# Altium footprint library ref-packages-longpad.PCBLIB: 1527 footprints (part 39 of 103)
Each footprint in its own frame and in the unit in brackets; x right, y up, seen from the top. Pads: shape width x height; smd on the part's side, far side on the other; paste and mask are expansions set on the pad; w line width, h text height; cw(c..) or ccw(c..) is an arc to the next point about the centre after c.
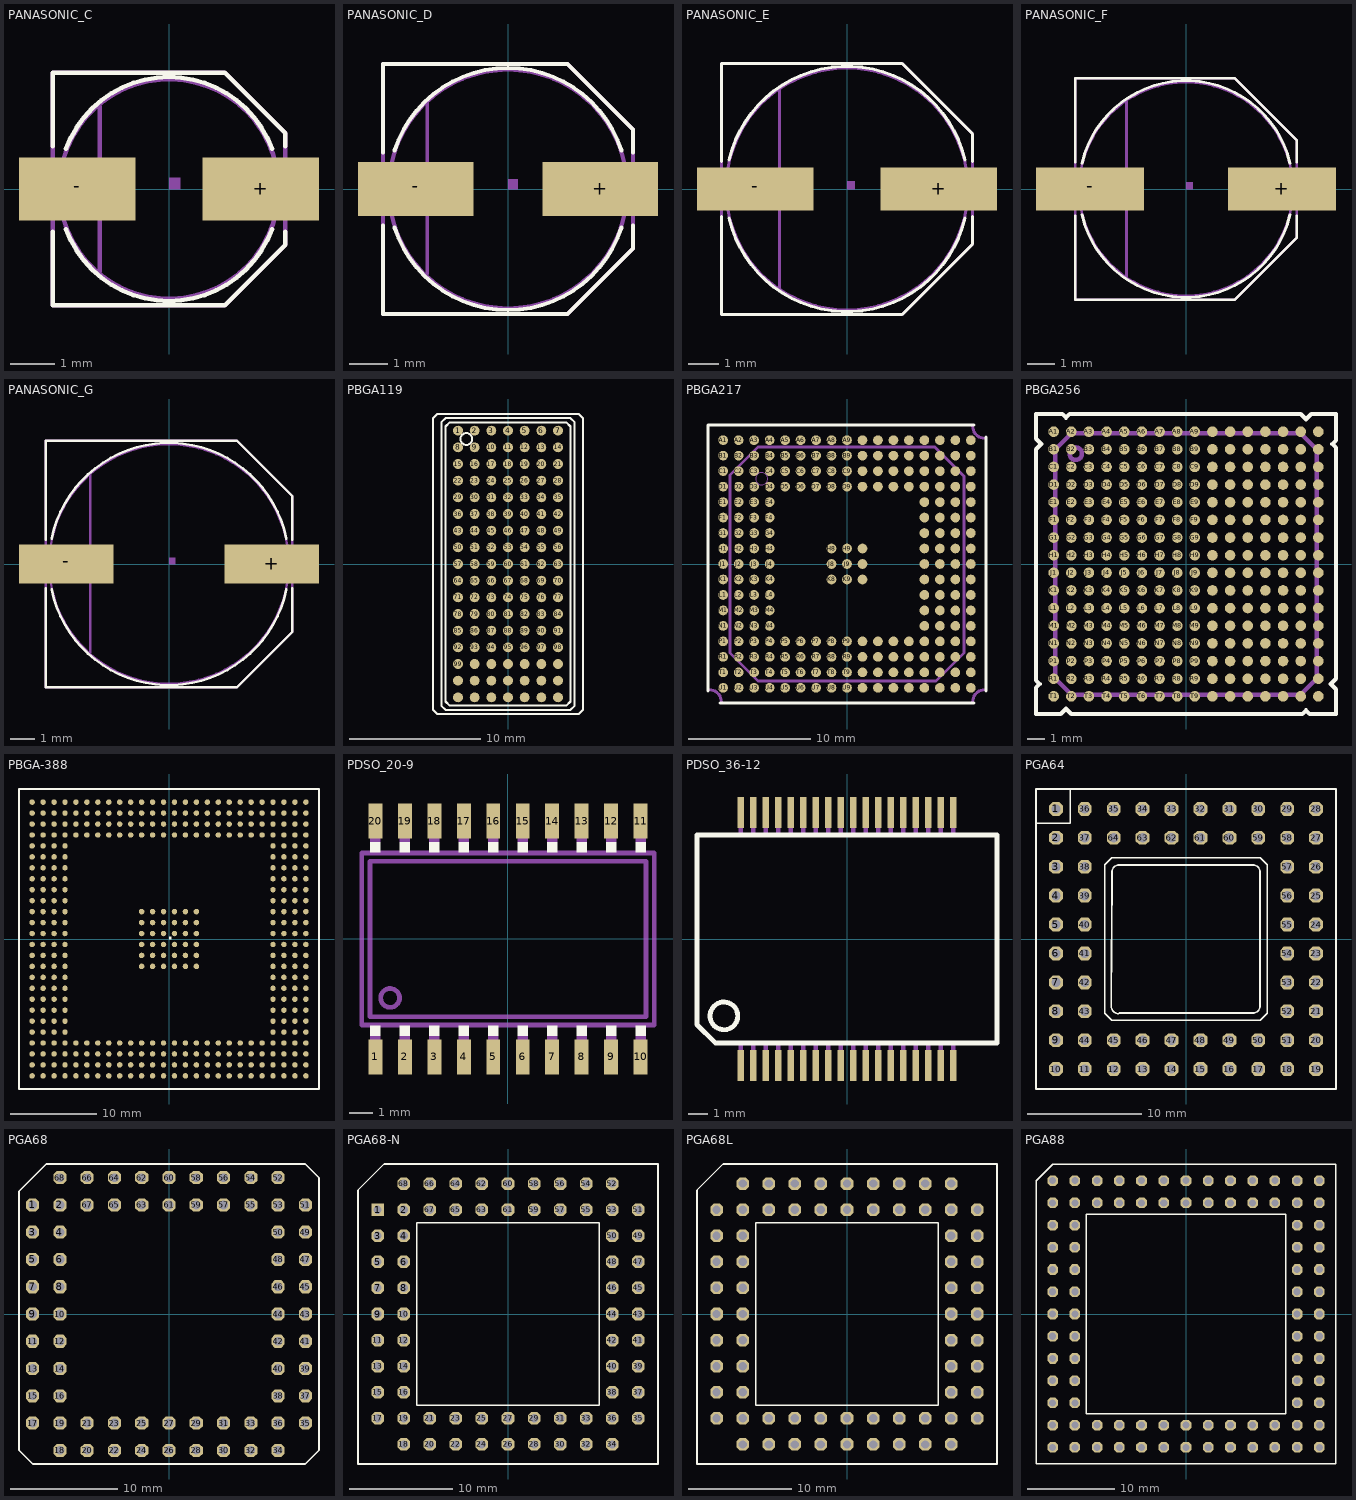
[diagram p38: the footprints below, top view; thin cyan lines are the x and y axes]

## PANASONIC_C [mil]
pads (2):
  rect 102.36x55.12 smd: +(80.71,0) -(-80.71,0)
Top Overlay:
  lines w4: -102.36,-37.4 -102.36,-102.36 49.21,-102.36 102.36,-49.21 102.36,-37.4 ; -102.36,37.4 -102.36,102.36 49.21,102.36 102.36,49.21 102.36,37.4 ; -90.55,-35.46 ccw(c0,-1.95) 90.55,-35.46 ; -90.55,35.46 cw(c0,1.95) 90.55,35.46
Mechanical 16:
  circle w4: c0,0 r96.46
  rectangle: -116.14,-13.78 -94.49,13.78
  rectangle: 94.49,-13.78 116.14,13.78
  region: 0,0 10,0 10,10 0,10
  lines w4: -61.02,-72.83 -61.02,72.83 ; -102.36,-102.36 49.21,-102.36 102.36,-49.21 102.36,49.21 49.21,102.36 -102.36,102.36 -102.36,-102.36

## PANASONIC_D [mm]
pads (2):
  rect 3x1.4 smd: +(2.4,0) -(-2.4,0)
Top Overlay:
  lines w0.102: -3.25,-0.95 -3.25,-3.25 1.55,-3.25 3.25,-1.55 3.25,-0.95 ; -3.25,0.95 -3.25,3.25 1.55,3.25 3.25,1.55 3.25,0.95 ; -2.95,-1.001 ccw(c0,-0.048) 2.95,-1.001 ; -2.95,1.001 cw(c0,0.048) 2.95,1.001
Mechanical 16:
  circle w0.102: c0,0 r3.1
  rectangle: -3.65,-0.35 -3.05,0.35
  rectangle: 3.05,-0.35 3.65,0.35
  region: 0,0 0.254,0 0.254,0.254 0,0.254
  lines w0.102: -2.1,-2.2 -2.1,2.25 ; -3.25,-3.25 1.55,-3.25 3.25,-1.55 3.25,1.55 1.55,3.25 -3.25,3.25 -3.25,-3.25

## PANASONIC_E [mm]
pads (2):
  rect 3.8x1.4 smd: +(3,0) -(-3,0)
Top Overlay:
  lines w0.102: -4.1,-0.9 -4.1,-4.1 1.8,-4.1 4.1,-1.8 4.1,-0.9 ; -4.1,0.9 -4.1,4.1 1.8,4.1 4.1,1.8 4.1,0.9 ; -3.85,-0.951 ccw(c0,-0.057) 3.85,-0.951 ; -3.85,0.951 cw(c0,0.057) 3.85,0.951
Mechanical 16:
  circle w0.102: c0,0 r3.95
  rectangle: -4.5,-0.35 -3.8,0.35
  rectangle: 3.8,-0.35 4.5,0.35
  region: 0,0 0.254,0 0.254,0.254 0,0.254
  lines w0.102: -2.2,-3.25 -2.2,3.25 ; -4.1,-4.1 1.8,-4.1 4.1,-1.8 4.1,1.8 1.8,4.1 -4.1,4.1 -4.1,-4.1

## PANASONIC_F [mm]
pads (2):
  rect 4x1.6 smd: +(3.55,0) -(-3.55,0)
Top Overlay:
  lines w0.102: -4.1,-1 -4.1,-4.1 1.8,-4.1 4.1,-1.8 4.1,-1 ; -4.1,1 -4.1,4.1 1.8,4.1 4.1,1.8 4.1,1 ; -3.85,-0.951 ccw(c0,-0.057) 3.85,-0.951 ; -3.85,0.951 cw(c0,0.057) 3.85,0.951
Mechanical 16:
  circle w0.001: c0,0 r4
  circle w0.102: c0,0 r3.95
  rectangle: -4.85,-0.45 -3.9,0.45
  rectangle: 3.9,-0.45 4.85,0.45
  region: 0,0 0.254,0 0.254,0.254 0,0.254
  lines w0.102: -2.2,-3.25 -2.2,3.25 ; -4.1,-4.1 1.8,-4.1 4.1,-1.8 4.1,1.8 1.8,4.1 -4.1,4.1 -4.1,-4.1

## PANASONIC_G [mil]
pads (2):
  rect 153.54x62.99 smd: +(167.32,0) -(-167.32,0)
Top Overlay:
  lines w4: -200.79,-39.37 -200.79,-200.79 110.24,-200.79 200.79,-110.24 200.79,-39.37 ; -200.79,39.37 -200.79,200.79 110.24,200.79 200.79,110.24 200.79,39.37 ; -190.94,-41.37 ccw(c0,-2.28) 190.94,-41.37 ; -190.94,41.37 cw(c0,2.28) 190.94,41.37
Mechanical 16:
  circle w4: c0,0 r194.88
  rectangle: -230.32,-17.72 -192.91,17.72
  rectangle: 192.91,-17.72 230.32,17.72
  region: 0,0 10,0 10,10 0,10
  lines w4: -127.95,-143.7 -127.95,145.67 ; -200.79,-200.79 110.24,-200.79 200.79,-110.24 200.79,110.24 110.24,200.79 -200.79,200.79 -200.79,-200.79

## PBGA119 [mil]
pads (119):
  rrect100% 29.53x29.53 smd: 1(-150,400) 2(-100,400) 3(-50,400) 4(0,400) 5(50,400) 6(100,400) 7(150,400) 8(-150,350) 9(-100,350) 10(-50,350) 11(0,350) 12(50,350) 13(100,350) 14(150,350) 15(-150,300) 16(-100,300) 17(-50,300) 18(0,300) 19(50,300) 20(100,300) 21(150,300) 22(-150,250) 23(-100,250) 24(-50,250) 25(0,250) 26(50,250) 27(100,250) 28(150,250) 29(-150,200) 30(-100,200) 31(-50,200) 32(0,200) 33(50,200) 34(100,200) 35(150,200) 36(-150,150) 37(-100,150) 38(-50,150) 39(0,150) 40(50,150) 41(100,150) 42(150,150) 43(-150,100) 44(-100,100) 45(-50,100) 46(0,100) 47(50,100) 48(100,100) 49(150,100) 50(-150,50) 51(-100,50) 52(-50,50) 53(0,50) 54(50,50) 55(100,50) 56(150,50) 57(-150,0) 58(-100,0) 59(-50,0) 60(0,0) 61(50,0) 62(100,0) 63(150,0) 64(-150,-50) 65(-100,-50) 66(-50,-50) 67(0,-50) 68(50,-50) 69(100,-50) 70(150,-50) 71(-150,-100) 72(-100,-100) 73(-50,-100) 74(0,-100) 75(50,-100) 76(100,-100) 77(150,-100) 78(-150,-150) 79(-100,-150) 80(-50,-150) 81(0,-150) 82(50,-150) 83(100,-150) 84(150,-150) 85(-150,-200) 86(-100,-200) 87(-50,-200) 88(0,-200) 89(50,-200) 90(100,-200) 91(150,-200) 92(-150,-250) 93(-100,-250) 94(-50,-250) 95(0,-250) 96(50,-250) 97(100,-250) 98(150,-250) 99(-150,-300) 100(-100,-300) 101(-50,-300) 102(0,-300) 103(50,-300) 104(100,-300) 105(150,-300) 106(-150,-350) 107(-100,-350) 108(-50,-350) 109(0,-350) 110(50,-350) 111(100,-350) 112(150,-350) 113(-150,-400) 114(-100,-400) 115(-50,-400) 116(0,-400) 117(50,-400) 118(100,-400) 119(150,-400)
Top Overlay:
  circle w6: c-125,375 r17.68
  lines w6: -225,-437.5 -225,437.5 -212.5,450 212.5,450 225,437.5 225,-437.5 212.5,-450 -212.5,-450 -225,-437.5 ; -200,-425 -187.5,-437.5 187.5,-437.5 200,-425 200,425 187.5,437.5 -187.5,437.5 -200,425 -200,-425 ; -187.5,-412.5 -187.5,412.5 -175,425 175,425 187.5,412.5 187.5,-412.5 175,-425 -175,-425 -187.5,-412.5

## PBGA217 [mil]
pads (217):
  rrect100% 31.5x31.5 smd: A1(-400,400) A2(-350,400) A3(-300,400) A4(-250,400) A5(-200,400) A6(-150,400) A7(-100,400) A8(-50,400) A9(0,400) A10(50,400) A11(100,400) A12(150,400) A13(200,400) A14(250,400) A15(300,400) A16(350,400) A17(400,400) B1(-400,350) B2(-350,350) B3(-300,350) B4(-250,350) B5(-200,350) B6(-150,350) B7(-100,350) B8(-50,350) B9(0,350) B10(50,350) B11(100,350) B12(150,350) B13(200,350) B14(250,350) B15(300,350) B16(350,350) B17(400,350) C1(-400,300) C2(-350,300) C3(-300,300) C4(-250,300) C5(-200,300) C6(-150,300) C7(-100,300) C8(-50,300) C9(0,300) C10(50,300) C11(100,300) C12(150,300) C13(200,300) C14(250,300) C15(300,300) C16(350,300) C17(400,300) D1(-400,250) D2(-350,250) D3(-300,250) D4(-250,250) D5(-200,250) D6(-150,250) D7(-100,250) D8(-50,250) D9(0,250) D10(50,250) D11(100,250) D12(150,250) D13(200,250) D14(250,250) D15(300,250) D16(350,250) D17(400,250) E1(-400,200) E2(-350,200) E3(-300,200) E4(-250,200) E14(250,200) E15(300,200) E16(350,200) E17(400,200) F1(-400,150) F2(-350,150) F3(-300,150) F4(-250,150) F14(250,150) F15(300,150) F16(350,150) F17(400,150) G1(-400,100) G2(-350,100) G3(-300,100) G4(-250,100) G14(250,100) G15(300,100) G16(350,100) G17(400,100) H1(-400,50) H2(-350,50) H3(-300,50) H4(-250,50) H8(-50,50) H9(0,50) H10(50,50) H14(250,50) H15(300,50) H16(350,50) H17(400,50) J1(-400,0) J2(-350,0) J3(-300,0) J4(-250,0) J8(-50,0) J9(0,0) J10(50,0) J14(250,0) J15(300,0) J16(350,0) J17(400,0) K1(-400,-50) K2(-350,-50) K3(-300,-50) K4(-250,-50) K8(-50,-50) K9(0,-50) K10(50,-50) K14(250,-50) K15(300,-50) K16(350,-50) K17(400,-50) L1(-400,-100) L2(-350,-100) L3(-300,-100) L4(-250,-100) L14(250,-100) L15(300,-100) L16(350,-100) L17(400,-100) M1(-400,-150) M2(-350,-150) M3(-300,-150) M4(-250,-150) M14(250,-150) M15(300,-150) M16(350,-150) M17(400,-150) N1(-400,-200) N2(-350,-200) N3(-300,-200) N4(-250,-200) N14(250,-200) N15(300,-200) N16(350,-200) N17(400,-200) P1(-400,-250) P2(-350,-250) P3(-300,-250) P4(-250,-250) P5(-200,-250) P6(-150,-250) P7(-100,-250) P8(-50,-250) P9(0,-250) P10(50,-250) P11(100,-250) P12(150,-250) P13(200,-250) P14(250,-250) P15(300,-250) P16(350,-250) P17(400,-250) R1(-400,-300) R2(-350,-300) R3(-300,-300) R4(-250,-300) R5(-200,-300) R6(-150,-300) R7(-100,-300) R8(-50,-300) R9(0,-300) R10(50,-300) R11(100,-300) R12(150,-300) R13(200,-300) R14(250,-300) R15(300,-300) R16(350,-300) R17(400,-300) T1(-400,-350) T2(-350,-350) T3(-300,-350) T4(-250,-350) T5(-200,-350) T6(-150,-350) T7(-100,-350) T8(-50,-350) T9(0,-350) T10(50,-350) T11(100,-350) T12(150,-350) T13(200,-350) T14(250,-350) T15(300,-350) T16(350,-350) T17(400,-350) U1(-400,-400) U2(-350,-400) U3(-300,-400) U4(-250,-400) U5(-200,-400) U6(-150,-400) U7(-100,-400) U8(-50,-400) U9(0,-400) U10(50,-400) U11(100,-400) U12(150,-400) U13(200,-400) U14(250,-400) U15(300,-400) U16(350,-400) U17(400,-400)
Top Overlay:
  lines w10: -448.82,-409.45 -448.82,448.82 409.45,448.82 ; -409.45,-448.82 409.45,-448.82 ; 448.82,-409.45 448.82,409.45
Mechanical 16:
  circle w0: c-275.59,275.59 r19.69
  lines w10: -445.28,-405.91 cw(c-445.28,-445.28) -405.91,-445.28 ; 405.91,-445.28 cw(c445.28,-445.28) 445.28,-405.91 ; 405.91,445.28 ccw(c445.28,445.28) 445.28,405.91 ; -377.95,-287.4 -287.4,-377.95 287.4,-377.95 377.95,-287.4 377.95,283.46 283.46,377.95 -287.4,377.95 -377.95,287.4 -377.95,-287.4

## PBGA256 [mil]
pads (256):
  rrect100% 23.62x23.62 smd: A1(-295.28,295.28) A2(-255.91,295.28) A3(-216.54,295.28) A4(-177.17,295.28) A5(-137.8,295.28) A6(-98.43,295.28) A7(-59.06,295.28) A8(-19.69,295.28) A9(19.69,295.28) A10(59.06,295.28) A11(98.43,295.28) A12(137.8,295.28) A13(177.17,295.28) A14(216.54,295.28) A15(255.91,295.28) A16(295.28,295.28) B1(-295.28,255.91) B2(-255.91,255.91) B3(-216.54,255.91) B4(-177.17,255.91) B5(-137.8,255.91) B6(-98.43,255.91) B7(-59.06,255.91) B8(-19.69,255.91) B9(19.69,255.91) B10(59.06,255.91) B11(98.43,255.91) B12(137.8,255.91) B13(177.17,255.91) B14(216.54,255.91) B15(255.91,255.91) B16(295.28,255.91) C1(-295.28,216.54) C2(-255.91,216.54) C3(-216.54,216.54) C4(-177.17,216.54) C5(-137.8,216.54) C6(-98.43,216.54) C7(-59.06,216.54) C8(-19.69,216.54) C9(19.69,216.54) C10(59.06,216.54) C11(98.43,216.54) C12(137.8,216.54) C13(177.17,216.54) C14(216.54,216.54) C15(255.91,216.54) C16(295.28,216.54) D1(-295.28,177.17) D2(-255.91,177.17) D3(-216.54,177.17) D4(-177.17,177.17) D5(-137.8,177.17) D6(-98.43,177.17) D7(-59.06,177.17) D8(-19.69,177.17) D9(19.69,177.17) D10(59.06,177.17) D11(98.43,177.17) D12(137.8,177.17) D13(177.17,177.17) D14(216.54,177.17) D15(255.91,177.17) D16(295.28,177.17) E1(-295.28,137.8) E2(-255.91,137.8) E3(-216.54,137.8) E4(-177.17,137.8) E5(-137.8,137.8) E6(-98.43,137.8) E7(-59.06,137.8) E8(-19.69,137.8) E9(19.69,137.8) E10(59.06,137.8) E11(98.43,137.8) E12(137.8,137.8) E13(177.17,137.8) E14(216.54,137.8) E15(255.91,137.8) E16(295.28,137.8) F1(-295.28,98.43) F2(-255.91,98.43) F3(-216.54,98.43) F4(-177.17,98.43) F5(-137.8,98.43) F6(-98.43,98.43) F7(-59.06,98.43) F8(-19.69,98.43) F9(19.69,98.43) F10(59.06,98.43) F11(98.43,98.43) F12(137.8,98.43) F13(177.17,98.43) F14(216.54,98.43) F15(255.91,98.43) F16(295.28,98.43) G1(-295.28,59.06) G2(-255.91,59.06) G3(-216.54,59.06) G4(-177.17,59.06) G5(-137.8,59.06) G6(-98.43,59.06) G7(-59.06,59.06) G8(-19.69,59.06) G9(19.69,59.06) G10(59.06,59.06) G11(98.43,59.06) G12(137.8,59.06) G13(177.17,59.06) G14(216.54,59.06) G15(255.91,59.06) G16(295.28,59.06) H1(-295.28,19.69) H2(-255.91,19.69) H3(-216.54,19.69) H4(-177.17,19.69) H5(-137.8,19.69) H6(-98.43,19.69) H7(-59.06,19.69) H8(-19.69,19.69) H9(19.69,19.69) H10(59.06,19.69) H11(98.43,19.69) H12(137.8,19.69) H13(177.17,19.69) H14(216.54,19.69) H15(255.91,19.69) H16(295.28,19.69) J1(-295.28,-19.69) J2(-255.91,-19.69) J3(-216.54,-19.69) J4(-177.17,-19.69) J5(-137.8,-19.69) J6(-98.43,-19.69) J7(-59.06,-19.69) J8(-19.69,-19.69) J9(19.69,-19.69) J10(59.06,-19.69) J11(98.43,-19.69) J12(137.8,-19.69) J13(177.17,-19.69) J14(216.54,-19.69) J15(255.91,-19.69) J16(295.28,-19.69) K1(-295.28,-59.06) K2(-255.91,-59.06) K3(-216.54,-59.06) K4(-177.17,-59.06) K5(-137.8,-59.06) K6(-98.43,-59.06) K7(-59.06,-59.06) K8(-19.69,-59.06) K9(19.69,-59.06) K10(59.06,-59.06) K11(98.43,-59.06) K12(137.8,-59.06) K13(177.17,-59.06) K14(216.54,-59.06) K15(255.91,-59.06) K16(295.28,-59.06) L1(-295.28,-98.43) L2(-255.91,-98.43) L3(-216.54,-98.43) L4(-177.17,-98.43) L5(-137.8,-98.43) L6(-98.43,-98.43) L7(-59.06,-98.43) L8(-19.69,-98.43) L9(19.69,-98.43) L10(59.06,-98.43) L11(98.43,-98.43) L12(137.8,-98.43) L13(177.17,-98.43) L14(216.54,-98.43) L15(255.91,-98.43) L16(295.28,-98.43) M1(-295.28,-137.8) M2(-255.91,-137.8) M3(-216.54,-137.8) M4(-177.17,-137.8) M5(-137.8,-137.8) M6(-98.43,-137.8) M7(-59.06,-137.8) M8(-19.69,-137.8) M9(19.69,-137.8) M10(59.06,-137.8) M11(98.43,-137.8) M12(137.8,-137.8) M13(177.17,-137.8) M14(216.54,-137.8) M15(255.91,-137.8) M16(295.28,-137.8) N1(-295.28,-177.17) N2(-255.91,-177.17) N3(-216.54,-177.17) N4(-177.17,-177.17) N5(-137.8,-177.17) N6(-98.43,-177.17) N7(-59.06,-177.17) N8(-19.69,-177.17) N9(19.69,-177.17) N10(59.06,-177.17) N11(98.43,-177.17) N12(137.8,-177.17) N13(177.17,-177.17) N14(216.54,-177.17) N15(255.91,-177.17) N16(295.28,-177.17) P1(-295.28,-216.54) P2(-255.91,-216.54) P3(-216.54,-216.54) P4(-177.17,-216.54) P5(-137.8,-216.54) P6(-98.43,-216.54) P7(-59.06,-216.54) P8(-19.69,-216.54) P9(19.69,-216.54) P10(59.06,-216.54) P11(98.43,-216.54) P12(137.8,-216.54) P13(177.17,-216.54) P14(216.54,-216.54) P15(255.91,-216.54) P16(295.28,-216.54) R1(-295.28,-255.91) R2(-255.91,-255.91) R3(-216.54,-255.91) R4(-177.17,-255.91) R5(-137.8,-255.91) R6(-98.43,-255.91) R7(-59.06,-255.91) R8(-19.69,-255.91) R9(19.69,-255.91) R10(59.06,-255.91) R11(98.43,-255.91) R12(137.8,-255.91) R13(177.17,-255.91) R14(216.54,-255.91) R15(255.91,-255.91) R16(295.28,-255.91) T1(-295.28,-295.28) T2(-255.91,-295.28) T3(-216.54,-295.28) T4(-177.17,-295.28) T5(-137.8,-295.28) T6(-98.43,-295.28) T7(-59.06,-295.28) T8(-19.69,-295.28) T9(19.69,-295.28) T10(59.06,-295.28) T11(98.43,-295.28) T12(137.8,-295.28) T13(177.17,-295.28) T14(216.54,-295.28) T15(255.91,-295.28) T16(295.28,-295.28)
Top Overlay:
  lines w10: -334.65,-334.65 -334.65,-275.59 -326.77,-267.72 -334.65,-259.84 -334.65,255.91 -322.83,267.72 -334.65,279.53 -334.65,334.65 -275.59,334.65 -267.72,326.77 -259.84,334.65 255.91,334.65 267.72,322.83 279.53,334.65 334.65,334.65 334.65,275.59 326.77,267.72 334.65,259.84 334.65,-255.91 322.83,-267.72 334.65,-279.53 334.65,-334.65 275.59,-334.65 267.72,-326.77 259.84,-334.65 -255.91,-334.65 -267.72,-322.83 -279.53,-334.65 -334.65,-334.65
Mechanical 16:
  circle w10: c-246.06,246.06 r13.92
  lines w10: -291.34,-255.91 -255.91,-291.34 255.91,-291.34 291.34,-255.91 291.34,255.91 255.91,291.34 -255.91,291.34 -291.34,255.91 -291.34,-255.91

## PBGA-388 [mil]
pads (388):
  rrect100% 25x25 smd: A1(-625,625) A2(-575,625) A3(-525,625) A4(-475,625) A5(-425,625) A6(-375,625) A7(-325,625) A8(-275,625) A9(-225,625) A10(-175,625) A11(-125,625) A12(-75,625) A13(-25,625) A14(25,625) A15(75,625) A16(125,625) A17(175,625) A18(225,625) A19(275,625) A20(325,625) A21(375,625) A22(425,625) A23(475,625) A24(525,625) A25(575,625) A26(625,625) AA1(-625,-375) AA2(-575,-375) AA3(-525,-375) AA4(-475,-375) AA23(475,-375) AA24(525,-375) AA25(575,-375) AA26(625,-375) AB1(-625,-425) AB2(-575,-425) AB3(-525,-425) AB4(-475,-425) AB23(475,-425) AB24(525,-425) AB25(575,-425) AB26(625,-425) AC1(-625,-475) AC2(-575,-475) AC3(-525,-475) AC4(-475,-475) AC5(-425,-475) AC6(-375,-475) AC7(-325,-475) AC8(-275,-475) AC9(-225,-475) AC10(-175,-475) AC11(-125,-475) AC12(-75,-475) AC13(-25,-475) AC14(25,-475) AC15(75,-475) AC16(125,-475) AC17(175,-475) AC18(225,-475) AC19(275,-475) AC20(325,-475) AC21(375,-475) AC22(425,-475) AC23(475,-475) AC24(525,-475) AC25(575,-475) AC26(625,-475) AD1(-625,-525) AD2(-575,-525) AD3(-525,-525) AD4(-475,-525) AD5(-425,-525) AD6(-375,-525) AD7(-325,-525) AD8(-275,-525) AD9(-225,-525) AD10(-175,-525) AD11(-125,-525) AD12(-75,-525) AD13(-25,-525) AD14(25,-525) AD15(75,-525) AD16(125,-525) AD17(175,-525) AD18(225,-525) AD19(275,-525) AD20(325,-525) AD21(375,-525) AD22(425,-525) AD23(475,-525) AD24(525,-525) AD25(575,-525) AD26(625,-525) AE1(-625,-575) AE2(-575,-575) AE3(-525,-575) AE4(-475,-575) AE5(-425,-575) AE6(-375,-575) AE7(-325,-575) AE8(-275,-575) AE9(-225,-575) AE10(-175,-575) AE11(-125,-575) AE12(-75,-575) AE13(-25,-575) AE14(25,-575) AE15(75,-575) AE16(125,-575) AE17(175,-575) AE18(225,-575) AE19(275,-575) AE20(325,-575) AE21(375,-575) AE22(425,-575) AE23(475,-575) AE24(525,-575) AE25(575,-575) AE26(625,-575) AF1(-625,-625) AF2(-575,-625) AF3(-525,-625) AF4(-475,-625) AF5(-425,-625) AF6(-375,-625) AF7(-325,-625) AF8(-275,-625) AF9(-225,-625) AF10(-175,-625) AF11(-125,-625) AF12(-75,-625) AF13(-25,-625) AF14(25,-625) AF15(75,-625) AF16(125,-625) AF17(175,-625) AF18(225,-625) AF19(275,-625) AF20(325,-625) AF21(375,-625) AF22(425,-625) AF23(475,-625) AF24(525,-625) AF25(575,-625) AF26(625,-625) B1(-625,575) B2(-575,575) B3(-525,575) B4(-475,575) B5(-425,575) B6(-375,575) B7(-325,575) B8(-275,575) B9(-225,575) B10(-175,575) B11(-125,575) B12(-75,575) B13(-25,575) B14(25,575) B15(75,575) B16(125,575) B17(175,575) B18(225,575) B19(275,575) B20(325,575) B21(375,575) B22(425,575) B23(475,575) B24(525,575) B25(575,575) B26(625,575) C1(-625,525) C2(-575,525) C3(-525,525) C4(-475,525) C5(-425,525) C6(-375,525) C7(-325,525) C8(-275,525) C9(-225,525) C10(-175,525) C11(-125,525) C12(-75,525) C13(-25,525) C14(25,525) C15(75,525) C16(125,525) C17(175,525) C18(225,525) C19(275,525) C20(325,525) C21(375,525) C22(425,525) C23(475,525) C24(525,525) C25(575,525) C26(625,525) D1(-625,475) D2(-575,475) D3(-525,475) D4(-475,475) D5(-425,475) D6(-375,475) D7(-325,475) D8(-275,475) D9(-225,475) D10(-175,475) D11(-125,475) D12(-75,475) D13(-25,475) D14(25,475) D15(75,475) D16(125,475) D17(175,475) D18(225,475) D19(275,475) D20(325,475) D21(375,475) D22(425,475) D23(475,475) D24(525,475) D25(575,475) D26(625,475) E1(-625,425) E2(-575,425) E3(-525,425) E4(-475,425) E23(475,425) E24(525,425) E25(575,425) E26(625,425) F1(-625,375) F2(-575,375) F3(-525,375) F4(-475,375) F23(475,375) F24(525,375) F25(575,375) F26(625,375) G1(-625,325) G2(-575,325) G3(-525,325) G4(-475,325) G23(475,325) G24(525,325) G25(575,325) G26(625,325) H1(-625,275) H2(-575,275) H3(-525,275) H4(-475,275) H23(475,275) H24(525,275) H25(575,275) H26(625,275) J1(-625,225) J2(-575,225) J3(-525,225) J4(-475,225) J23(475,225) J24(525,225) J25(575,225) J26(625,225) K1(-625,175) K2(-575,175) K3(-525,175) K4(-475,175) K23(475,175) K24(525,175) K25(575,175) K26(625,175) L1(-625,125) L2(-575,125) L3(-525,125) L4(-475,125) L11(-125,125) L12(-75,125) L13(-25,125) L14(25,125) L15(75,125) L16(125,125) L23(475,125) L24(525,125) L25(575,125) L26(625,125) M1(-625,75) M2(-575,75) M3(-525,75) M4(-475,75) M11(-125,75) M12(-75,75) M13(-25,75) M14(25,75) M15(75,75) M16(125,75) M23(475,75) M24(525,75) M25(575,75) M26(625,75) N1(-625,25) N2(-575,25) N3(-525,25) N4(-475,25) N11(-125,25) N12(-75,25) N13(-25,25) N14(25,25) N15(75,25) N16(125,25) N23(475,25) N24(525,25) N25(575,25) N26(625,25) P1(-625,-25) P2(-575,-25) P3(-525,-25) P4(-475,-25) P11(-125,-25) P12(-75,-25) P13(-25,-25) P14(25,-25) P15(75,-25) P16(125,-25) P23(475,-25) P24(525,-25) P25(575,-25) P26(625,-25) R1(-625,-75) R2(-575,-75) R3(-525,-75) R4(-475,-75) R11(-125,-75) R12(-75,-75) R13(-25,-75) R14(25,-75) R15(75,-75) R16(125,-75) R23(475,-75) R24(525,-75) R25(575,-75) R26(625,-75) T1(-625,-125) T2(-575,-125) T3(-525,-125) T4(-475,-125) T11(-125,-125) T12(-75,-125) T13(-25,-125) T14(25,-125) T15(75,-125) T16(125,-125) T23(475,-125) T24(525,-125) T25(575,-125) T26(625,-125) U1(-625,-175) U2(-575,-175) U3(-525,-175) U4(-475,-175) U23(475,-175) U24(525,-175) U25(575,-175) U26(625,-175) V1(-625,-225) V2(-575,-225) V3(-525,-225) V4(-475,-225) V23(475,-225) V24(525,-225) V25(575,-225) V26(625,-225) W1(-625,-275) W2(-575,-275) W3(-525,-275) W4(-475,-275) W23(475,-275) W24(525,-275) W25(575,-275) W26(625,-275) Y1(-625,-325) Y2(-575,-325) Y3(-525,-325) Y4(-475,-325) Y23(475,-325) Y24(525,-325) Y25(575,-325) Y26(625,-325)
Top Overlay:
  region: 0,0 10,0 10,10 0,10
  lines w8: -685.04,-685.04 685.04,-685.04 685.04,685.04 -685.04,685.04 -685.04,-685.04

## PDSO_20-9 [mil]
pads (20):
  rect 23.62x59.06 smd: 1(-225,-200) 2(-175,-200) 3(-125,-200) 4(-75,-200) 5(-25,-200) 6(25,-200) 7(75,-200) 8(125,-200) 9(175,-200) 10(225,-200) 11(225,200) 12(175,200) 13(125,200) 14(75,200) 15(25,200) 16(-25,200) 17(-75,200) 18(-125,200) 19(-175,200) 20(-225,200)
Top Overlay:
  rectangle: -234,-165 -216,-147
  rectangle: -184,-165 -166,-147
  rectangle: -134,-165 -116,-147
  rectangle: -84,-165 -66,-147
  rectangle: -34,-165 -16,-147
  rectangle: 16,-165 34,-147
  rectangle: 66,-165 84,-147
  rectangle: 116,-165 134,-147
  rectangle: 166,-165 184,-147
  rectangle: 216,-165 234,-147
  rectangle: 216,147 234,165
  rectangle: 166,147 184,165
  rectangle: 116,147 134,165
  rectangle: 66,147 84,165
  rectangle: 16,147 34,165
  rectangle: -34,147 -16,165
  rectangle: -84,147 -66,165
  rectangle: -134,147 -116,165
  rectangle: -184,147 -166,165
  rectangle: -234,147 -216,165
Mechanical 16:
  circle w8: c-200,-100 r16
  rectangle: -234,-203 -216,-165
  rectangle: -184,-203 -166,-165
  rectangle: -134,-203 -116,-165
  rectangle: -84,-203 -66,-165
  rectangle: -34,-203 -16,-165
  rectangle: 16,-203 34,-165
  rectangle: 66,-203 84,-165
  rectangle: 116,-203 134,-165
  rectangle: 166,-203 184,-165
  rectangle: 216,-203 234,-165
  rectangle: 216,165 234,203
  rectangle: 166,165 184,203
  rectangle: 116,165 134,203
  rectangle: 66,165 84,203
  rectangle: 16,165 34,203
  rectangle: -34,165 -16,203
  rectangle: -84,165 -66,203
  rectangle: -134,165 -116,203
  rectangle: -184,165 -166,203
  rectangle: -234,165 -216,203
  lines w8: -248,-146 248,-146 248,146 -248,146 -248,-146 ; -234,-132 234,-132 234,132 -234,132 -234,-132

## PDSO_36-12 [mm]
pads (36):
  rect 0.35x1.6 smd: 1(-5.525,-6.575) 2(-4.875,-6.575) 3(-4.225,-6.575) 4(-3.575,-6.575) 5(-2.925,-6.575) 6(-2.275,-6.575) 7(-1.625,-6.575) 8(-0.975,-6.575) 9(-0.325,-6.575) 10(0.325,-6.575) 11(0.975,-6.575) 12(1.625,-6.575) 13(2.275,-6.575) 14(2.925,-6.575) 15(3.575,-6.575) 16(4.225,-6.575) 17(4.875,-6.575) 18(5.525,-6.575) 19(5.525,6.575) 20(4.875,6.575) 21(4.225,6.575) 22(3.575,6.575) 23(2.925,6.575) 24(2.275,6.575) 25(1.625,6.575) 26(0.975,6.575) 27(0.325,6.575) 28(-0.325,6.575) 29(-0.975,6.575) 30(-1.625,6.575) 31(-2.275,6.575) 32(-2.925,6.575) 33(-3.575,6.575) 34(-4.225,6.575) 35(-4.875,6.575) 36(-5.525,6.575)
Top Overlay:
  circle w0.254: c-6.4,-4 r0.721
  lines w0.254: -7.8,-4.45 -7.8,5.4 7.8,5.4 7.8,-5.4 -6.85,-5.4 -7.8,-4.45
Mechanical 16:
  rectangle: -5.65,-7.1 -5.4,-5.5
  rectangle: -5,-7.1 -4.75,-5.5
  rectangle: -4.35,-7.1 -4.1,-5.5
  rectangle: -3.7,-7.1 -3.45,-5.5
  rectangle: -3.05,-7.1 -2.8,-5.5
  rectangle: -2.4,-7.1 -2.15,-5.5
  rectangle: -1.75,-7.1 -1.5,-5.5
  rectangle: -1.1,-7.1 -0.85,-5.5
  rectangle: -0.45,-7.1 -0.2,-5.5
  rectangle: 0.2,-7.1 0.45,-5.5
  rectangle: 0.85,-7.1 1.1,-5.5
  rectangle: 1.5,-7.1 1.75,-5.5
  rectangle: 2.15,-7.1 2.4,-5.5
  rectangle: 2.8,-7.1 3.05,-5.5
  rectangle: 3.45,-7.1 3.7,-5.5
  rectangle: 4.1,-7.1 4.35,-5.5
  rectangle: 4.75,-7.1 5,-5.5
  rectangle: 5.4,-7.1 5.65,-5.5
  rectangle: 5.4,5.5 5.65,7.1
  rectangle: 4.75,5.5 5,7.1
  rectangle: 4.1,5.5 4.35,7.1
  rectangle: 3.45,5.5 3.7,7.1
  rectangle: 2.8,5.5 3.05,7.1
  rectangle: 2.15,5.5 2.4,7.1
  rectangle: 1.5,5.5 1.75,7.1
  rectangle: 0.85,5.5 1.1,7.1
  rectangle: 0.2,5.5 0.45,7.1
  rectangle: -0.45,5.5 -0.2,7.1
  rectangle: -1.1,5.5 -0.85,7.1
  rectangle: -1.75,5.5 -1.5,7.1
  rectangle: -2.4,5.5 -2.15,7.1
  rectangle: -3.05,5.5 -2.8,7.1
  rectangle: -3.7,5.5 -3.45,7.1
  rectangle: -4.35,5.5 -4.1,7.1
  rectangle: -5,5.5 -4.75,7.1
  rectangle: -5.65,5.5 -5.4,7.1

## PGA64 [mil]
pads (64):
  oct 48x48 hole 32: 1(-450,450) 2(-450,350) 3(-450,250) 4(-450,150) 5(-450,50) 6(-450,-50) 7(-450,-150) 8(-450,-250) 9(-450,-350) 10(-450,-450) 11(-350,-450) 12(-250,-450) 13(-150,-450) 14(-50,-450) 15(50,-450) 16(150,-450) 17(250,-450) 18(350,-450) 19(450,-450) 20(450,-350) 21(450,-250) 22(450,-150) 23(450,-50) 24(450,50) 25(450,150) 26(450,250) 27(450,350) 28(450,450) 29(350,450) 30(250,450) 31(150,450) 32(50,450) 33(-50,450) 34(-150,450) 35(-250,450) 36(-350,450) 37(-350,350) 38(-350,250) 39(-350,150) 40(-350,50) 41(-350,-50) 42(-350,-150) 43(-350,-250) 44(-350,-350) 45(-250,-350) 46(-150,-350) 47(-50,-350) 48(50,-350) 49(150,-350) 50(250,-350) 51(350,-350) 52(350,-250) 53(350,-150) 54(350,-50) 55(350,50) 56(350,150) 57(350,250) 58(350,350) 59(250,350) 60(150,350) 61(50,350) 62(-50,350) 63(-150,350) 64(-250,350)
Top Overlay:
  lines w6: -518.75,37.5 -518.73,18.76 ; -233.37,-258.37 cw(c-233.38,-233.38) -258.37,-233.37 -256.26,231.26 cw(c-231.26,231.26) -231.26,256.26 231.25,256.25 cw(c231.25,231.25) 256.25,231.25 256.25,-231.25 cw(c231.25,-231.25) 231.25,-256.25 -231.25,-256.25 ; -518.73,18.76 -518.75,-518.75 518.74,-518.74 518.75,518.75 -400,518.74 ; -518.73,18.76 -518.74,400 ; -518.74,400 -518.74,518.74 -400,518.74 ; -518.74,400 -400,400 -400,518.74 ; -281.25,-256.25 -281.26,256.26 -256.26,281.26 256.25,281.25 281.25,256.25 281.26,-256.26 256.26,-281.26 -256.25,-281.25 -281.25,-256.25

## PGA68 [mil]
pads (68):
  oct 48x48 hole 32: 1(-500,400) 2(-400,400) 3(-500,300) 4(-400,300) 5(-500,200) 6(-400,200) 7(-500,100) 8(-400,100) 9(-500,0) 10(-400,0) 11(-500,-100) 12(-400,-100) 13(-500,-200) 14(-400,-200) 15(-500,-300) 16(-400,-300) 17(-500,-400) 18(-400,-500) 19(-400,-400) 20(-300,-500) 21(-300,-400) 22(-200,-500) 23(-200,-400) 24(-100,-500) 25(-100,-400) 26(0,-500) 27(0,-400) 28(100,-500) 29(100,-400) 30(200,-500) 31(200,-400) 32(300,-500) 33(300,-400) 34(400,-500) 35(500,-400) 36(400,-400) 37(500,-300) 38(400,-300) 39(500,-200) 40(400,-200) 41(500,-100) 42(400,-100) 43(500,0) 44(400,0) 45(500,100) 46(400,100) 47(500,200) 48(400,200) 49(500,300) 50(400,300) 51(500,400) 52(400,500) 53(400,400) 54(300,500) 55(300,400) 56(200,500) 57(200,400) 58(100,500) 59(100,400) 60(0,500) 61(0,400) 62(-100,500) 63(-100,400) 64(-200,500) 65(-200,400) 66(-300,500) 67(-300,400) 68(-400,500)
Top Overlay:
  lines w6: -550,-500 -500,-550 500,-550 550,-500 550,500 500,550 -450,550 -550,450 -550,-500

## PGA68-N [mil]
pads (68):
  rect 48x48 hole 32: 1(-500,400)
  oct 48x48 hole 32: 2(-400,400) 3(-500,300) 4(-400,300) 5(-500,200) 6(-400,200) 7(-500,100) 8(-400,100) 9(-500,0) 10(-400,0) 11(-500,-100) 12(-400,-100) 13(-500,-200) 14(-400,-200) 15(-500,-300) 16(-400,-300) 17(-500,-400) 18(-400,-500) 19(-400,-400) 20(-300,-500) 21(-300,-400) 22(-200,-500) 23(-200,-400) 24(-100,-500) 25(-100,-400) 26(0,-500) 27(0,-400) 28(100,-500) 29(100,-400) 30(200,-500) 31(200,-400) 32(300,-500) 33(300,-400) 34(400,-500) 35(500,-400) 36(400,-400) 37(500,-300) 38(400,-300) 39(500,-200) 40(400,-200) 41(500,-100) 42(400,-100) 43(500,0) 44(400,0) 45(500,100) 46(400,100) 47(500,200) 48(400,200) 49(500,300) 50(400,300) 51(500,400) 52(400,500) 53(400,400) 54(300,500) 55(300,400) 56(200,500) 57(200,400) 58(100,500) 59(100,400) 60(0,500) 61(0,400) 62(-100,500) 63(-100,400) 64(-200,500) 65(-200,400) 66(-300,500) 67(-300,400) 68(-400,500)
Top Overlay:
  lines w6: -575,-575 575,-575 575,575 -475,575 -575,475 -575,-575 ; -350,-350 -350,350 350,350 350,-350 -350,-350

## PGA68L [mil]
pads (68):
  oct 48x48 hole 32: A02(-400,500) A03(-300,500) A04(-200,500) A05(-100,500) A06(0,500) A07(100,500) A08(200,500) A09(300,500) A10(400,500) B01(-500,400) B02(-400,400) B03(-300,400) B04(-200,400) B05(-100,400) B06(0,400) B07(100,400) B08(200,400) B09(300,400) B10(400,400) B11(500,400) C01(-500,300) C02(-400,300) C10(400,300) C11(500,300) D01(-500,200) D02(-400,200) D10(400,200) D11(500,200) E01(-500,100) E02(-400,100) E10(400,100) E11(500,100) F01(-500,0) F02(-400,0) F10(400,0) F11(500,0) G01(-500,-100) G02(-400,-100) G10(400,-100) G11(500,-100) H01(-500,-200) H02(-400,-200) H10(400,-200) H11(500,-200) J01(-500,-300) J02(-400,-300) J10(400,-300) J11(500,-300) K01(-500,-400) K02(-400,-400) K03(-300,-400) K04(-200,-400) K05(-100,-400) K06(0,-400) K07(100,-400) K08(200,-400) K09(300,-400) K10(400,-400) K11(500,-400) L02(-400,-500) L03(-300,-500) L04(-200,-500) L05(-100,-500) L06(0,-500) L07(100,-500) L08(200,-500) L09(300,-500) L10(400,-500)
Top Overlay:
  lines w6: -575,-575 575,-575 575,575 -475,575 -575,475 -575,-575 ; -350,-350 350,-350 350,350 -350,350 -350,-350

## PGA88 [mil]
pads (88):
  oct 48x48 hole 32: A01(-600,600) A02(-500,600) A03(-400,600) A04(-300,600) A05(-200,600) A06(-100,600) A07(0,600) A08(100,600) A09(200,600) A10(300,600) A11(400,600) A12(500,600) A13(600,600) B01(-600,500) B02(-500,500) B03(-400,500) B04(-300,500) B05(-200,500) B06(-100,500) B07(0,500) B08(100,500) B09(200,500) B10(300,500) B11(400,500) B12(500,500) B13(600,500) C01(-600,400) C02(-500,400) C12(500,400) C13(600,400) D01(-600,300) D02(-500,300) D12(500,300) D13(600,300) E01(-600,200) E02(-500,200) E12(500,200) E13(600,200) F01(-600,100) F02(-500,100) F12(500,100) F13(600,100) G01(-600,0) G02(-500,0) G12(500,0) G13(600,0) H01(-600,-100) H02(-500,-100) H12(500,-100) H13(600,-100) J01(-600,-200) J02(-500,-200) J12(500,-200) J13(600,-200) K01(-600,-300) K02(-500,-300) K12(500,-300) K13(600,-300) L01(-600,-400) L02(-500,-400) L12(500,-400) L13(600,-400) M01(-600,-500) M02(-500,-500) M03(-400,-500) M04(-300,-500) M05(-200,-500) M06(-100,-500) M07(0,-500) M08(100,-500) M09(200,-500) M10(300,-500) M11(400,-500) M12(500,-500) M13(600,-500) N01(-600,-600) N02(-500,-600) N03(-400,-600) N04(-300,-600) N05(-200,-600) N06(-100,-600) N07(0,-600) N08(100,-600) N09(200,-600) N10(300,-600) N11(400,-600) N12(500,-600) N13(600,-600)
Top Overlay:
  lines w6: -675,-675 675,-675 675,675 -600,675 -675,600 -675,-675 ; -450,-450 450,-450 450,450 -450,450 -450,-450